# Altium footprint library Foot_Lib.PcbLib: 31 footprints (part 2 of 2)
Each footprint in its own frame and in the unit in brackets; x right, y up, seen from the top. Pads: shape width x height; smd on the part's side, far side on the other; paste and mask are expansions set on the pad; w line width, h text height; cw(c..) or ccw(c..) is an arc to the next point about the centre after c.
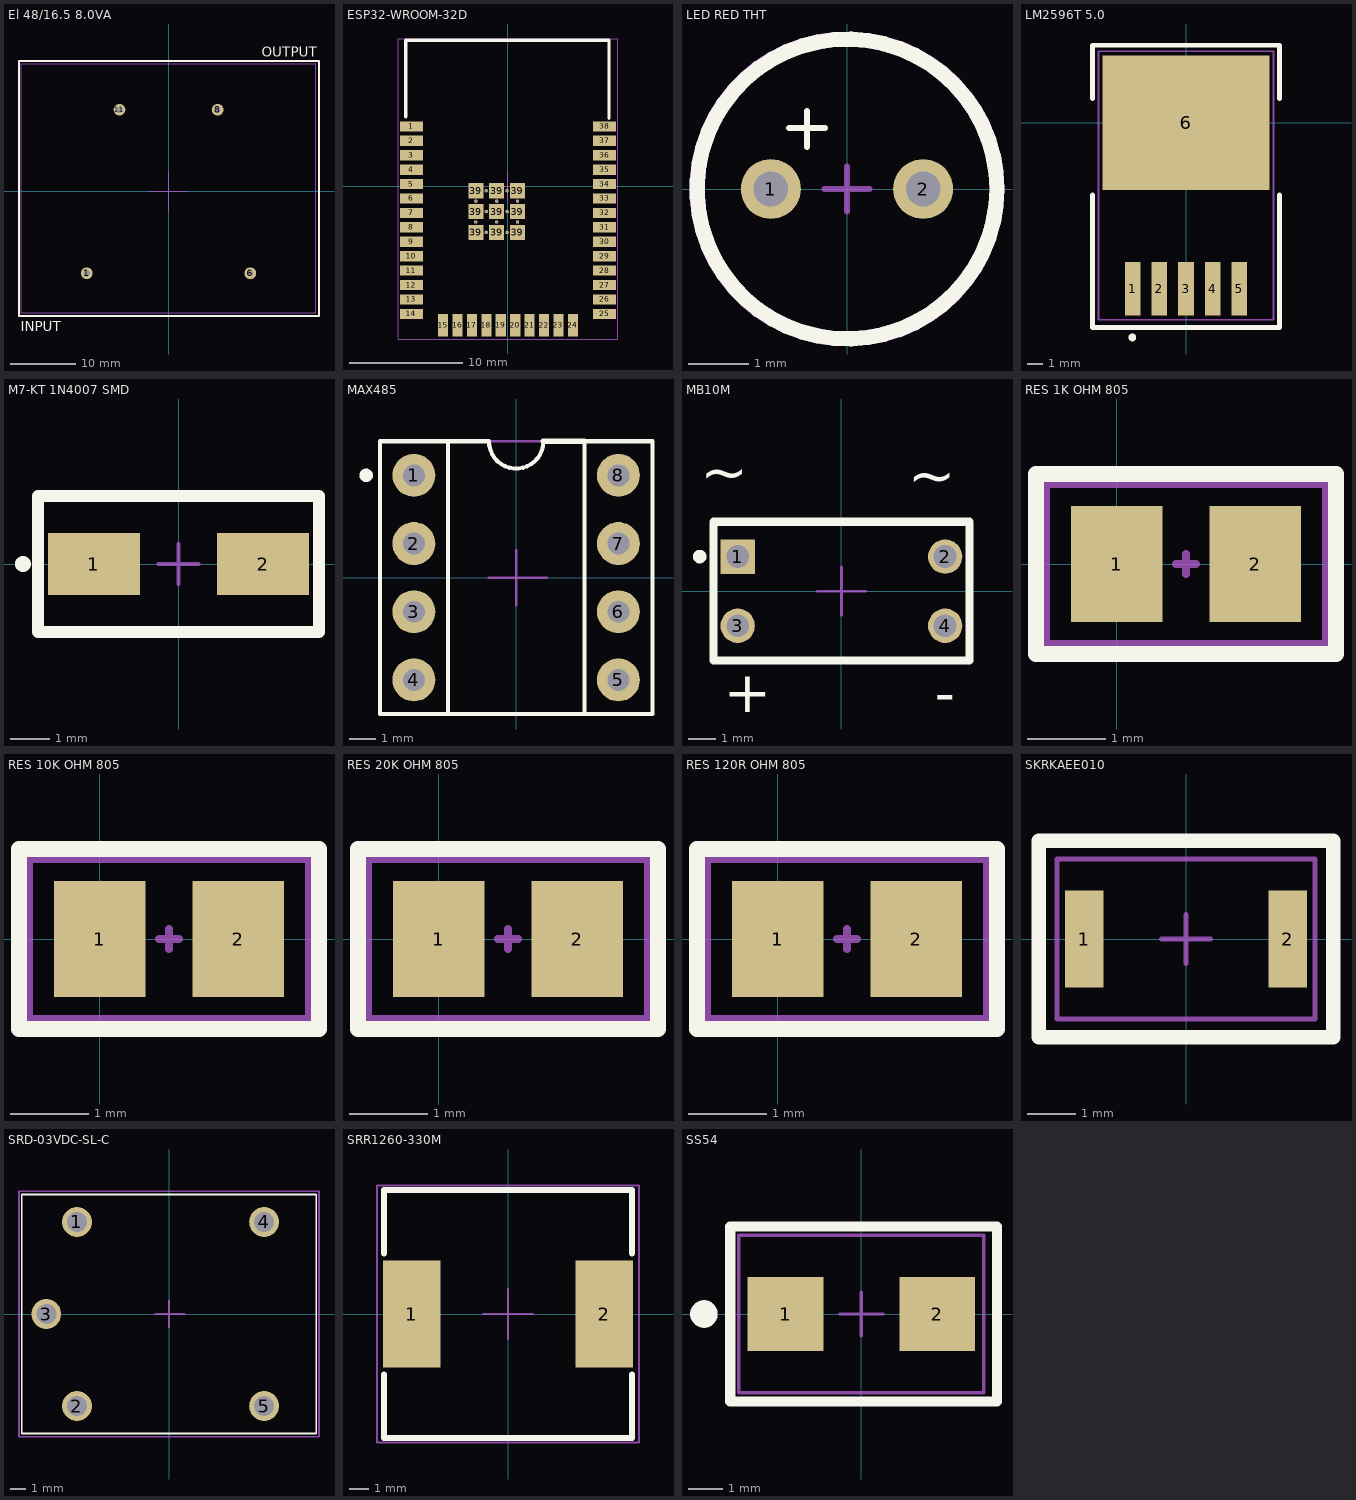
[diagram p1: the footprints below, top view; thin cyan lines are the x and y axes]

## El 48/16.5 8.0VA [mm]
pads (4):
  round 1.8 hole 0.95: 1(-12.5,-12.5) 6(12.5,-12.5) 8(7.5,12.5) 11(-7.5,12.5)
Top Overlay:
  lines w0.3: -22.86,-19.05 23,-19.05 23,19.939 -22.86,19.939 -22.86,-19.05
  text "OUTPUT" at 14.224,20.574 h1.52
  text "INPUT" at -22.606,-21.336 h1.52
Top Component Center:
  lines w0.1: -3,0 0,0 ; 0,-3 0,0 ; 0,3 0,0 ; 3,0 0,0 ; -22.5,-18.5 -22.5,19.5 22.5,19.5 22.5,-18.5 -22.5,-18.5
Top Designator:
  text ".Designator" at 0.254,0.762 h1.52
3D body "trafo_no_logo.STEP": height 38.5, standoff -5.5, extent -22.5,-18.5 22.5,19.5

## ESP32-WROOM-32D [mm]
pads (59):
  rect 2x0.9 smd mask+0.05: 1(-8.5,5.26) 2(-8.5,3.99) 3(-8.5,2.72) 4(-8.5,1.45) 5(-8.5,0.18) 6(-8.5,-1.09) 7(-8.5,-2.36) 8(-8.5,-3.63) 9(-8.5,-4.9) 10(-8.5,-6.17) 11(-8.5,-7.44) 12(-8.5,-8.71) 13(-8.5,-9.98) 14(-8.5,-11.25) 25(8.5,-11.25) 26(8.5,-9.98) 27(8.5,-8.71) 28(8.5,-7.44) 29(8.5,-6.17) 30(8.5,-4.9) 31(8.5,-3.63) 32(8.5,-2.36) 33(8.5,-1.09) 34(8.5,0.18) 35(8.5,1.45) 36(8.5,2.72) 37(8.5,3.99) 38(8.5,5.26)
  rect 0.9x2 smd mask+0.05: 15(-5.715,-12.25) 16(-4.445,-12.25) 17(-3.175,-12.25) 18(-1.905,-12.25) 19(-0.635,-12.25) 20(0.635,-12.25) 21(1.905,-12.25) 22(3.175,-12.25) 23(4.445,-12.25) 24(5.715,-12.25)
  rect 1.33x1.33 smd mask+0.05: 39(-2.835,-4.075) 39(-2.835,-2.24) 39(-2.835,-0.405) 39(-1,-4.075) 39(-1,-2.24) 39(-1,-0.405) 39(0.835,-4.075) 39(0.835,-2.24) 39(0.835,-0.405)
  round 0.3 hole 0.2 mask+0.05: 39(-2.835,-3.157) 39(-2.835,-1.322) 39(-1.917,-4.075) 39(-1.917,-2.24) 39(-1.917,-0.405) 39(-1,-3.157) 39(-1,-1.322) 39(-0.082,-4.075) 39(-0.082,-2.24) 39(-0.082,-0.405) 39(0.835,-3.157) 39(0.835,-1.322)
Top Overlay:
  lines w0.3: -9.017,6.096 -9.017,12.827 8.89,12.827 8.89,5.969
Top Component Center:
  lines w0.1: -1.27,0 0,0 ; 0,-1.27 0,0 ; 0,1.27 0,0 ; 1.27,0 0,0 ; -9.652,-13.462 -9.652,12.954 9.652,12.954 9.652,-13.462 -6.096,-13.462 -9.652,-13.462
Top Designator:
  lines w0.1: -9.652,-13.462 -9.652,12.954 9.652,12.954 9.652,-13.462 -9.652,-13.462
  text ".Designator" at -3.173,1.524 h1.52
3D body "ESP-32 .step": height 2.61, standoff -0.1, extent -8.974,-12.6 8.926,12.8

## LED RED THT [mm]
pads (2):
  round 1 hole 0.58 mask+0.05: 1(-1.27,0) 2(1.27,0)
Top Overlay:
  circle w0.254: c0,0 r2.5
  lines w0.1: -0.97,1.016 -0.37,1.016 ; -0.67,0.7 -0.67,1.016 ; -0.67,1.3 -0.67,1.016 ; -0.664,1.016 -0.67,1.016 ; -0.645,1.016 -0.659,1.016 -0.67,1.016
Top Component Center:
  circle w0.254: c0,0 r2.502
  lines w0.1: -0.375,0 0,0 ; 0,-0.375 0,0 ; 0,0.375 0,0 ; 0.375,0 0,0
Top Designator:
  text ".Designator" at -0.196,0.912 h1.52
3D body "5mmLEDRed.STEP": height 8.7, standoff -11.9, extent -2.75,-2.75 2.75,2.75

## LM2596T 5.0 [mm]
pads (6):
  rect 1x3.4 smd paste-3 mask+0: 1(-3.4,-10.6) 2(-1.7,-10.6) 3(0,-10.6) 4(1.7,-10.6) 5(3.4,-10.6)
  rect 10.7x8.6 smd paste-6 mask+0: 6(0,0)
Top Overlay:
  circle w0.3: c-3.429,-13.716 r0.1
  lines w0.3: -5.969,-4.62 -5.969,-13.081 5.969,-13.081 5.969,-4.62 ; -5.969,1.524 -5.969,4.953 5.969,4.953 5.969,1.524
Top Paste:
  region: 5.3,4.25 5.3,-4.25 -5.3,-4.25 -5.3,4.25
  region: 0.45,-8.95 0.45,-12.25 -0.45,-12.25 -0.45,-8.95
  region: -1.25,-8.95 -1.25,-12.25 -2.15,-12.25 -2.15,-8.95
  region: -2.95,-8.95 -2.95,-12.25 -3.85,-12.25 -3.85,-8.95
  region: 2.15,-8.95 2.15,-12.25 1.25,-12.25 1.25,-8.95
  region: 3.85,-8.95 3.85,-12.25 2.95,-12.25 2.95,-8.95
Top Solder:
  region: 5.42,4.37 5.42,-4.37 -5.42,-4.37 -5.42,4.37
  region: 0.57,-8.83 0.57,-12.37 -0.57,-12.37 -0.57,-8.83
  region: -1.13,-8.83 -1.13,-12.37 -2.27,-12.37 -2.27,-8.83
  region: -2.83,-8.83 -2.83,-12.37 -3.97,-12.37 -3.97,-8.83
  region: 2.27,-8.83 2.27,-12.37 1.13,-12.37 1.13,-8.83
  region: 3.97,-8.83 3.97,-12.37 2.83,-12.37 2.83,-8.83
Top Component Center:
  lines w0.1: -1.143,0 0,0 ; 0,-1.143 0,0 ; 0,1.143 0,0 ; 1.143,0 0,0 ; -5.588,-12.573 -5.588,4.572 5.588,4.572 5.588,-12.573 -5.588,-12.573
Top Designator:
  text ".Designator" at -3.556,-6.477 h1.52
3D body "LM2596SX-ADJ.STEP": height 4.65, standoff -0.15, extent -5.08,-10.731 5.08,3.619

## M7-KT 1N4007 SMD [mm]
pads (2):
  rect 2.33x1.56 smd: 1(-2.14,0) 2(2.14,0)
Top Overlay:
  circle w0.2: c-3.937,0 r0.1
  lines w0.3: -3.555,-1.725 3.555,-1.725 3.555,1.725 -3.555,1.725 -3.555,-1.725
Top Component Center:
  lines w0.1: -0.508,0 0,0 ; 0,-0.508 0,0 ; 0,0.508 0,0 ; 0.508,0 0,0 ; -3.556,-1.778 -3.556,1.778 3.556,1.778 3.556,-1.778 -3.556,-1.778
Top Designator:
  text ".Designator" at -2.667,-0.381 h1.52
3D body "S1M--3DModel-STEP-56544.STEP": height 2.7, standoff 0, extent -2.727,-1.362 2.473,1.363

## MAX485 [mil]
pads (8):
  round 63 hole 32: 1(-150,150) 2(-150,50) 3(-150,-50) 4(-150,-150) 5(150,-150) 6(150,-50) 7(150,50) 8(150,150)
Top Overlay:
  circle w11.81: c-220,150 r3.94
  lines w6: 40,200 cw(c0,200) -40,200 -100,200 ; -100,-200 100,-200 ; -100,-200 -100,200 ; -100,-200 -200,-200 -200,200 -100,200 ; 100,-200 200,-200 200,200 100,200 100,-200
  lines w8: 40,200 100,200
Top Component Center:
  lines w3.94: -40,0 0,0 ; 0,-40 0,0 ; 0,40 0,0 ; 45,0 0,0 ; -200,-200 200,-200 200,200 -200,200 -200,-200
Top Designator:
  text ".Designator" at -65,9.99 h60
3D body "DIP8.STEP": height 147.64, standoff -82.68, extent -154.92,-181.1 154.92,181.1

## MB10M [mm]
pads (4):
  rect 1.26x1.26 hole 0.84: 1(-3.81,1.27)
  round 1.26 hole 0.84: 2(3.81,1.27) 3(-3.81,-1.27) 4(3.81,-1.27)
Top Overlay:
  circle w0.3: c-5.207,1.27 r0.1
  lines w0.3: -4.7,-2.55 -4.7,2.55 4.7,2.55 4.7,-2.55 -4.7,-2.55
  text "~" at -3.429,4.953 h1.52
  text "~" at 4.191,4.826 h1.52
  text "+" at -4.318,-4.445 h1.52
  text "-" at 3.433,-4.479 h1.52
Top Component Center:
  lines w0.1: -0.889,0 0,0 ; 0,-0.889 0,0 ; 0,0.889 0,0 ; 0.889,0 0,0 ; -4.699,-2.54 4.699,-2.54 4.699,2.54 -4.699,2.54 -4.699,-2.54
Top Designator:
  text ".Designator" at -2.921,-0.254 h1.52
3D body "DIP4.STEP": height 4.7, standoff -2.6, extent -3.935,-2.36 3.935,2.36

## RES 1K OHM 805 [mm]
pads (2):
  rect 1.16x1.47 smd: 1(0,0) 2(1.76,0)
Top Overlay:
  lines w0.2: -1.025,-1.143 2.785,-1.143 2.785,1.143 -1.025,1.143 -1.025,-1.143
Top Component Center:
  lines w0.1: 0.753,0 0.88,0 ; 0.88,-0.127 0.88,0 ; 0.88,0.127 0.88,0 ; 1.007,0 0.88,0 ; -0.898,-1.016 -0.898,1.016 2.658,1.016 2.658,-1.016 -0.898,-1.016
Top Designator:
  text ".Designator" at -0.644,1.143 h1.52
3D body "0805_RES.stp": height 0.61, standoff 0, extent -0.15,-0.586 1.85,0.664

## RES 10K OHM 805 [mm]
pads (2):
  rect 1.16x1.47 smd: 1(0,0) 2(1.76,0)
Top Overlay:
  lines w0.2: -1.025,-1.143 2.785,-1.143 2.785,1.143 -1.025,1.143 -1.025,-1.143
Top Component Center:
  lines w0.1: 0.753,0 0.88,0 ; 0.88,-0.127 0.88,0 ; 0.88,0.127 0.88,0 ; 1.007,0 0.88,0 ; -0.898,-1.016 -0.898,1.016 2.658,1.016 2.658,-1.016 -0.898,-1.016
Top Designator:
  text ".Designator" at -0.644,1.143 h1.52
3D body "0805_RES.stp": height 0.61, standoff 0, extent -0.15,-0.586 1.85,0.664

## RES 20K OHM 805 [mm]
pads (2):
  rect 1.16x1.47 smd: 1(0,0) 2(1.76,0)
Top Overlay:
  lines w0.2: -1.025,-1.143 2.785,-1.143 2.785,1.143 -1.025,1.143 -1.025,-1.143
Top Component Center:
  lines w0.1: 0.753,0 0.88,0 ; 0.88,-0.127 0.88,0 ; 0.88,0.127 0.88,0 ; 1.007,0 0.88,0 ; -0.898,-1.016 -0.898,1.016 2.658,1.016 2.658,-1.016 -0.898,-1.016
Top Designator:
  text ".Designator" at -0.644,1.143 h1.52
3D body "0805_RES.stp": height 0.61, standoff 0, extent -0.15,-0.586 1.85,0.664

## RES 120R OHM 805 [mm]
pads (2):
  rect 1.16x1.47 smd: 1(0,0) 2(1.76,0)
Top Overlay:
  lines w0.2: -1.025,-1.143 2.785,-1.143 2.785,1.143 -1.025,1.143 -1.025,-1.143
Top Component Center:
  lines w0.1: 0.753,0 0.88,0 ; 0.88,-0.127 0.88,0 ; 0.88,0.127 0.88,0 ; 1.007,0 0.88,0 ; -0.898,-1.016 -0.898,1.016 2.658,1.016 2.658,-1.016 -0.898,-1.016
Top Designator:
  text ".Designator" at -0.644,1.143 h1.52
3D body "0805_RES.stp": height 0.61, standoff 0, extent -0.15,-0.586 1.85,0.664

## SKRKAEE010 [mm]
pads (2):
  rect 0.8x2 smd: 1(-2.1,0) 2(2.1,0)
Top Overlay:
  lines w0.3: -3.048,-2.032 -3.048,2.032 3.048,2.032 3.048,-2.032 -3.048,-2.032
Top Component Center:
  lines w0.1: -0.508,0 0,0 ; 0,-0.508 0,0 ; 0,0.508 0,0 ; 0.508,0 0,0 ; -2.667,-1.651 -2.667,1.651 2.667,1.651 2.667,-1.651 -2.667,-1.651
Top Designator:
  text ".Designator" at -1.397,-0.127 h1.52
3D body "skrkaee010.stp": height 2, standoff 0, extent -2.4,-1.524 2.4,1.376

## SRD-03VDC-SL-C [mm]
pads (5):
  round 1.95 hole 1.3: 1(-6,6) 2(-6,-6) 3(-8,0) 4(6.2,6) 5(6.2,-6)
Top Overlay:
  lines w0.127: -9.6,-7.8 -9.6,7.8 ; -9.6,-7.8 9.6,-7.8 ; -9.6,-7.8 9.6,-7.8 ; -9.6,-7.8 -9.6,7.8 ; -9.6,7.8 9.6,7.8 ; -9.6,7.8 9.6,7.8 ; 9.6,-7.8 9.6,7.8 ; 9.6,-7.8 9.6,7.8
Top Component Center:
  lines w0.1: -0.889,0 0,0 ; 0,-0.889 0,0 ; 0,0.889 0,0 ; 1.016,0 0,0 ; -9.779,-8.001 9.779,-8.001 9.779,8.001 -9.779,8.001 -9.779,-8.001
Top Designator:
  text ".Designator" at -4.699,0.762 h1.52
3D body "User Library-SRD-05VDC-SL-C.step": height 15.4, standoff -5, extent -9.423,-7.623 9.677,7.877

## SRR1260-330M [mm]
pads (2):
  rect 2.9x5.4 smd: 1(-4.85,0) 2(4.85,0)
Top Overlay:
  lines w0.3: -6.25,-3.05 -6.25,-6.25 6.25,-6.25 6.25,-3.05 ; -6.25,3.05 -6.25,6.25 6.25,6.25 6.25,3.05
Top Component Center:
  lines w0.1: -1.27,0 0,0 ; 0,-1.27 0,0 ; 1.27,0 0,0 ; 0,0 0,1.27 0,0 ; -6.604,-6.477 6.604,-6.477 6.604,6.477 -6.604,6.477 -6.604,-6.477
Top Designator:
  text ".Designator" at -2.413,1.143 h1.52
3D body "srr1260-330m.stp": height 6, standoff 0, extent -6.25,-6.25 6.25,6.25

## SS54 [mm]
pads (2):
  rect 2.2x2.15 smd: 1(-2.2,0) 2(2.2,0)
Top Overlay:
  circle w0.4: c-4.572,0 r0.2
  lines w0.3: -3.81,-2.54 -3.81,-0.865 -3.81,0.865 -3.81,2.54 3.937,2.54 3.937,-2.54 -3.81,-2.54
Top Component Center:
  lines w0.1: -0.635,0 0,0 ; 0,-0.635 0,0 ; 0,0.635 0,0 ; 0.635,0 0,0 ; -3.556,-2.286 -3.556,2.286 3.556,2.286 3.556,-2.286 -3.556,-2.286
Top Designator:
  text ".Designator" at -0.762,-0.254 h1.52
3D body "S1M--3DModel-STEP-56544.STEP": height 2.7, standoff 0, extent -2.727,-1.362 2.473,1.363